# Altium footprint library MYLIB.PcbLib: 600 footprints (part 27 of 39)
Each footprint in its own frame and in the unit in brackets; x right, y up, seen from the top. Pads: shape width x height; smd on the part's side, far side on the other; paste and mask are expansions set on the pad; w line width, h text height; cw(c..) or ccw(c..) is an arc to the next point about the centre after c.
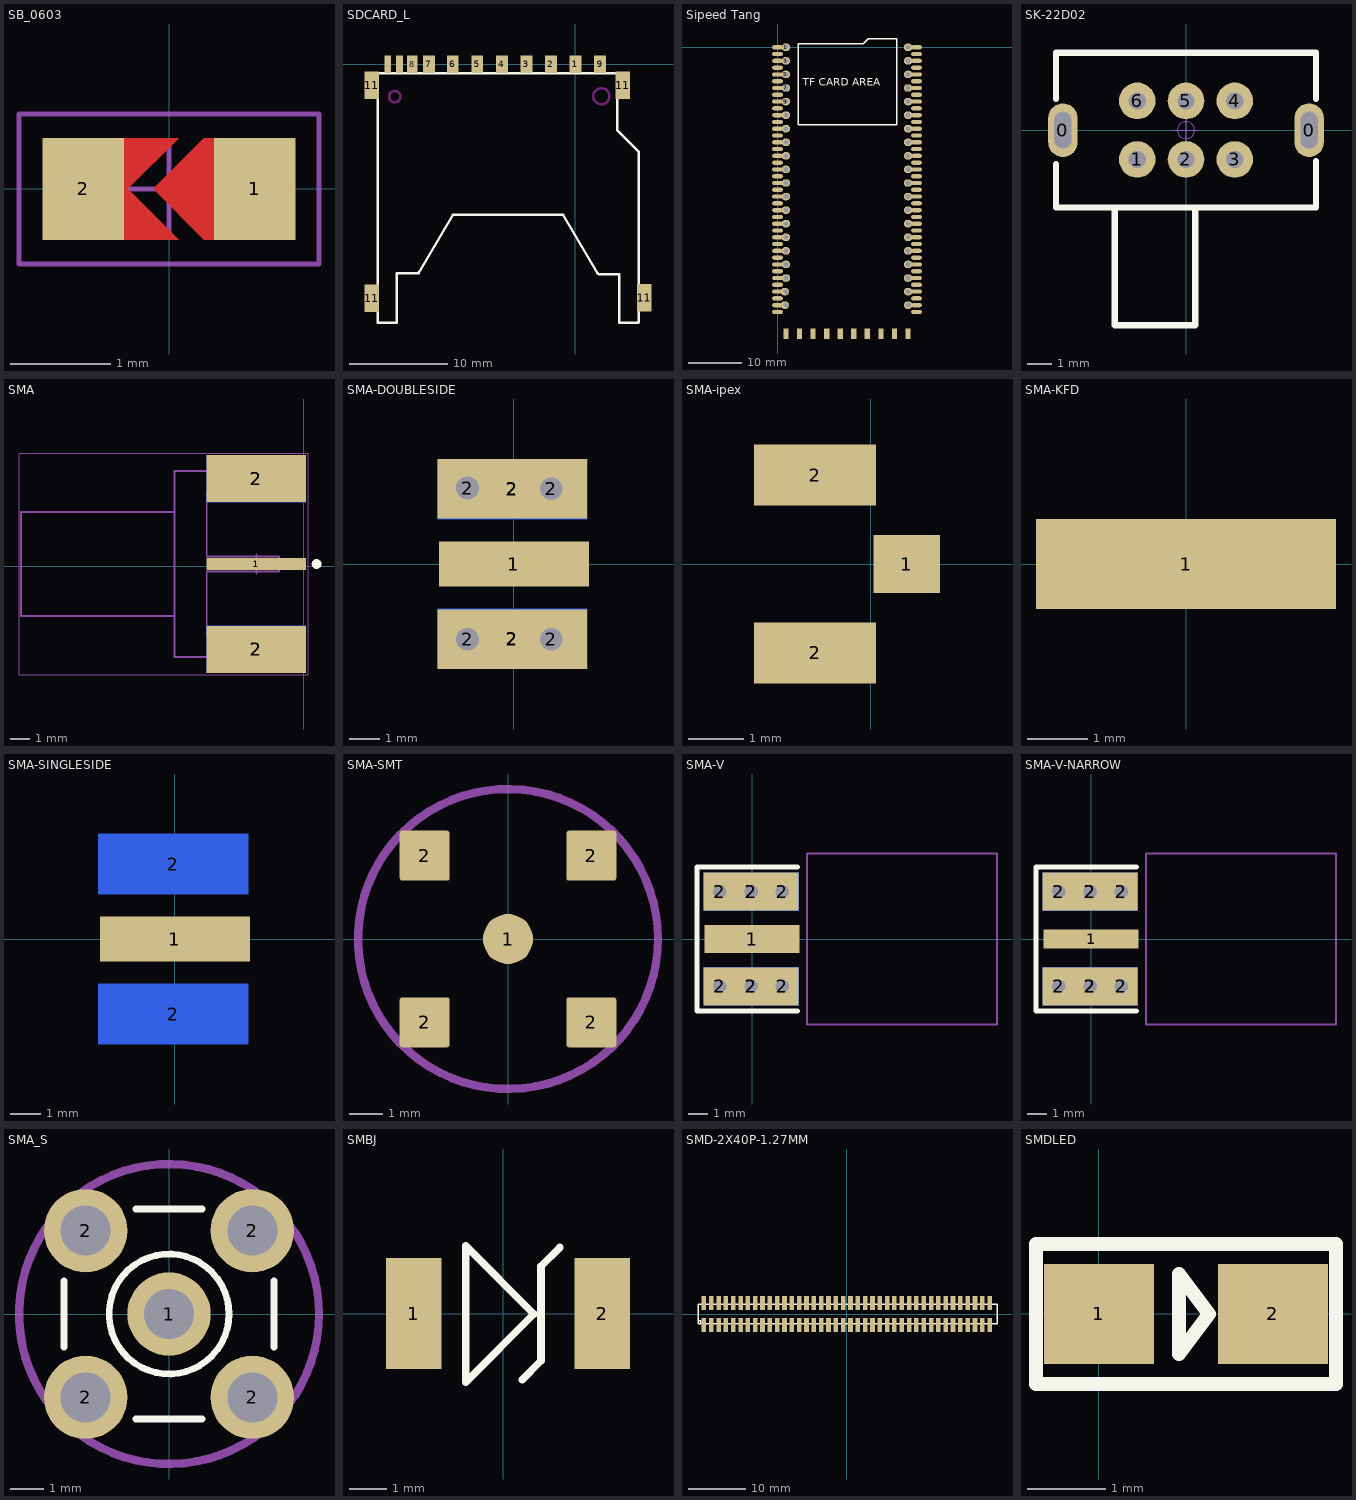
[diagram p26: the footprints below, top view; thin cyan lines are the x and y axes]

## SB_0603 [mil] "Jumper"
height 39.37
pads (2):
  rect 32x40 smd: 1(33.75,0) 2(-33.75,0)
Top Layer:
  region: 23.75,20 13.75,20 -6.25,0 13.75,-20 23.75,-20
  region: -26.25,0 -16.25,0 3.75,20 -26.25,20
  region: -26.25,0 -16.25,0 3.75,-20 -26.25,-20
Top Paste:
  region: 23.75,20 13.75,20 -6.25,0 13.75,-20 23.75,-20
  region: -26.25,0 -16.25,0 3.75,20 -26.25,20
  region: -26.25,0 -16.25,0 3.75,-20 -26.25,-20
Top Solder:
  region: 23.75,24 13.75,24 -10.25,0 13.75,-24 23.75,-24
  region: -26.25,0 -12.25,0 11.75,24 -26.25,24
  region: -26.25,0 -12.25,0 11.75,-24 -26.25,-24
Mechanical 15:
  lines w1.97: -18.7,0 18.7,0 ; 0,-18.7 0,18.7 ; -59.06,-29.53 -59.06,29.53 59.06,29.53 59.06,-29.53 -59.06,-29.53

## SDCARD_L [mm]
pads (15):
  rect 1.2x1.8 smd: 1(0,0) 2(-2.489,0) 3(-4.983,-0.009) 4(-7.483,-0.009) 5(-9.983,-0.009) 6(-12.483,-0.009) 7(-14.908,-0.009) 9(2.517,-0.009)
  rect 1.1x1.8 smd: 8(-16.612,0)
  rect 0.7x1.8 smd: 10(-17.908,-0.009) 12(-19.101,0)
  rect 1.5x2.8 smd: 11(-20.726,-23.834) 11(-20.726,-2.143) 11(4.826,-2.143) 11(7.01,-23.784)
Top Overlay:
  lines w0.254: -18.158,-21.3 -18.158,-26.3 -20.131,-26.3 -20.131,-0.914 -20.117,-0.9 4.242,-0.9 4.242,-6.71 6.431,-8.899 6.442,-8.899 6.442,-26.273 6.415,-26.3 4.442,-26.3 4.442,-21.402 2.4,-21.402 2.242,-21.244 ; -18.107,-21.294 -16.065,-21.294 -15.907,-21.136 ; -15.958,-21.294 -12.446,-15.3 ; -12.458,-15.3 -1.258,-15.3 2.242,-21.294
Keep-Out Layer:
  circle w0.254: c-18.39,-3.3 r0.58
  circle w0.254: c2.642,-3.26 r0.82

## Sipeed Tang [mm]
pads (130):
  oval 2x0.8 smd mask+0.051: 1(0,0) 2(0,-1.27) 3(0,-2.54) 4(0,-3.81) 5(0,-5.08) 6(0,-6.35) 7(0,-7.62) 8(0,-8.89) 9(0,-10.16) 10(0,-11.43) 11(0,-12.7) 12(0,-13.97) 13(0,-15.24) 14(0,-16.51) 15(0,-17.78) 16(0,-19.05) 17(0,-20.32) 18(0,-21.59) 19(0,-22.86) 20(0,-24.13) 21(0,-25.4) 22(0,-26.67) 23(0,-27.94) 24(0,-29.21) 25(0,-30.48) 26(0,-31.75) 27(0,-33.02) 28(0,-34.29) 29(0,-35.56) 30(0,-36.83) 31(0,-38.1) 32(0,-39.37) 33(0,-40.64) 34(0,-41.91) 35(0,-43.18) 36(0,-44.45) 37(0,-45.72) 38(0,-46.99) 39(0,-48.26) 40(0,-49.53) 41(26.01,-49.53) 42(26.01,-48.26) 43(26.01,-46.99) 44(26.01,-45.72) 45(26.01,-44.45) 46(26.01,-43.18) 47(26.01,-41.91) 48(26.01,-40.64) 49(26.01,-39.37) 50(26.01,-38.1) 51(26.01,-36.83) 52(26.01,-35.56) 53(26.01,-34.29) 54(26.01,-33.02) 55(26.01,-31.75) 56(26.01,-30.48) 57(26.01,-29.21) 58(26.01,-27.94) 59(26.01,-26.67) 60(26.01,-25.4) 61(26.01,-24.13) 62(26.01,-22.86) 63(26.01,-21.59) 64(26.01,-20.32) 65(26.01,-19.05) 66(26.01,-17.78) 67(26.01,-16.51) 68(26.01,-15.24) 69(26.01,-13.97) 70(26.01,-12.7) 71(26.01,-11.43) 72(26.01,-10.16) 73(26.01,-8.89) 74(26.01,-7.62) 75(26.01,-6.35) 76(26.01,-5.08) 77(26.01,-3.81) 78(26.01,-2.54) 79(26.01,-1.27) 80(26.01,0)
  oval 1.6x1.4 hole 0.9 mask+0.051: 1(1.575,0) 3(1.575,-2.54) 5(1.575,-5.08) 7(1.575,-7.62) 9(1.575,-10.16) 11(1.575,-12.7) 13(1.575,-15.24) 15(1.575,-17.78) 17(1.575,-20.32) 19(1.575,-22.86) 21(1.575,-25.4) 23(1.575,-27.94) 25(1.575,-30.48) 27(1.575,-33.02) 29(1.575,-35.56) 31(1.575,-38.1) 33(1.575,-40.64) 35(1.575,-43.18) 42(24.435,-48.26) 44(24.435,-45.72) 46(24.435,-43.18) 48(24.435,-40.64) 50(24.435,-38.1) 52(24.435,-35.56) 54(24.435,-33.02) 56(24.435,-30.48) 58(24.435,-27.94) 60(24.435,-25.4) 62(24.435,-22.86) 64(24.435,-20.32) 66(24.435,-17.78) 68(24.435,-15.24) 70(24.435,-12.7) 72(24.435,-10.16) 74(24.435,-7.62) 76(24.435,-5.08) 78(24.435,-2.54) 80(24.435,0)
  oval 1.6x1.4 hole 0.9 copper offset -0.2,0 mask+0.051: 37(1.575,-45.72) 39(1.575,-48.26)
  rect 1x2 smd mask+0.051: 81(1.575,-53.594) 82(4.115,-53.594) 83(6.655,-53.594) 84(9.195,-53.594) 85(11.735,-53.594) 86(14.275,-53.594) 87(16.815,-53.594) 88(19.355,-53.594) 89(21.895,-53.594) 90(24.435,-53.594)
Top Overlay:
  lines w0.254: 3.835,-14.478 3.835,0.66 16.053,0.66 16.942,1.549 17.704,1.549 22.327,1.549 22.327,-14.478 20.98,-14.478 6.045,-14.478 3.835,-14.478
  text "TF CARD AREA" at 4.699,-7.798 h2.5
3D body "LicheeTang-RV_3.28.step": height 3.72, standoff -2.16, extent 0.251,-55.485 25.781,3.06

## SK-22D02 [mm] "10.4x6.1x4.2mm(长宽高)，脚距：2mm"
pads (8):
  oval 1.2x2.2 hole 0.7 slot 1.5 at 90 deg: 0(-5.05,0) 0(5.05,0)
  round 1.5 hole 0.7: 1(-2,-1.2) 2(0,-1.2) 3(2,-1.2) 4(2,1.2) 5(0,1.2) 6(-2,1.2)
Top Overlay:
  lines w0.25: -5.334,-1.397 -5.334,-3.175 5.334,-3.175 5.334,-1.27 ; -5.334,1.27 -5.334,3.175 5.334,3.175 5.334,1.27 ; -2.921,-3.175 -2.921,-8.001 0.381,-8.001 0.381,-3.175
Mechanical 15:
  circle w0.05: c0,0 r0.35
  lines w0.05: -0.5,0 0.5,0 ; 0,-0.5 0,0.5
3D body "SK-22D02.STEP": height 5.59, standoff -2.61, extent -5.266,-7.963 5.254,3.047

## SMA [mil]
pads (5):
  rect 200x24 smd: 1(-96,5)
  rect 200x95 smd: 2(-96,-167.5) 2(-96,177.5)
  rect 200x95 smd far side: 2(-96,-167.5) 2(-96,177.5)
Top Overlay:
  circle w9.84: c25.65,5 r4.92
Mechanical 13:
  lines w3.94: -571,-100.12 -571,110.12 -261,110.12 ; -570.88,-100.12 -261,-100.12 ; -261,-182.5 -9,-182.5 -9,-142.5 -196,-142.5 -196,-10 -49.94,-10 -49.94,20 -196,20 -196,152.5 -9,152.5 -9,192.5 -261,192.5 -261,-182.5
Mechanical 15:
  lines w1.97: -574.94,-218.96 -574.94,228.94 7.94,228.94 7.94,-218.96 -574.94,-218.96
  lines w3.94: -115.69,5 -76.31,5 ; -96,-14.69 -96,24.68
3D body "142-0701-801.STEP": height 171.37, standoff -140.44, extent -570.81,-182.5 -9,192.3

## SMA-DOUBLESIDE [mil]
pads (9):
  rect 196.85x59.06 smd: 1(0,0)
  round 60 hole 30: 2(-61,-99) 2(-61,100) 2(49,-99) 2(49,99)
  rect 196.85x78.74 smd: 2(-2,-99) 2(-2,99)
  rect 196.85x78.74 smd far side: 2(-1.97,-98.43) 2(-1.97,98.43)
Bottom Overlay:
  lines w10: 94.49,-149.61 -114.17,-149.61 -114.17,149.61 94.49,149.61

## SMA-ipex [mm]
pads (3):
  rect 1.2x1.05 smd: 1(0.65,0)
  rect 2.2x1.1 smd: 2(-1,-1.6) 2(-1,1.6)

## SMA-KFD [mm]
pads (1):
  rect 5x1.5 smd: 1(0,0)

## SMA-SINGLESIDE [mm]
pads (3):
  rect 5x1.5 smd: 1(0,0)
  rect 5x2 smd far side: 2(-0.05,-2.5) 2(-0.05,2.5)
Bottom Overlay:
  lines w0.254: 2.4,-3.8 -2.9,-3.8 -2.9,3.8 2.4,3.8

## SMA-SMT [mm]
pads (5):
  round 1.5 smd: 1(0,0)
  rrect10% 1.5x1.5 smd: 2(-2.5,-2.5) 2(-2.5,2.5) 2(2.5,-2.5) 2(2.5,2.5)
Mechanical 13:
  circle w0.254: c0,0 r4.5

## SMA-V [mm]
pads (11):
  rect 5x1.5 smd: 1(0,0)
  round 1.27 hole 0.711: 2(-1.7,-2.5) 2(-1.7,2.5) 2(-0.05,-2.5) 2(-0.05,2.5) 2(1.6,-2.5) 2(1.6,2.5)
  rect 5x2 smd: 2(-0.05,-2.5) 2(-0.05,2.5)
  rect 5x2 smd far side: 2(-0.05,-2.5) 2(-0.05,2.5)
Top Overlay:
  lines w0.254: 2.4,-3.8 -2.9,-3.8 -2.9,3.8 2.4,3.8
Bottom Overlay:
  lines w0.254: 2.4,-3.8 -2.9,-3.8 -2.9,3.8 2.4,3.8
Mechanical 13:
  lines w0.1: 2.9,-4.5 12.9,-4.5 12.9,4.5 2.9,4.5 2.9,-4.5
3D body: height 4.5, standoff -4.5, extent 2.9,-4.5 12.9,4.5

## SMA-V-NARROW [mm]
pads (11):
  rect 5x1 smd: 1(0,0)
  round 1.27 hole 0.711: 2(-1.7,-2.5) 2(-1.7,2.5) 2(-0.05,-2.5) 2(-0.05,2.5) 2(1.6,-2.5) 2(1.6,2.5)
  rect 5x2 smd: 2(-0.05,-2.5) 2(-0.05,2.5)
  rect 5x2 smd far side: 2(-0.05,-2.5) 2(-0.05,2.5)
Top Overlay:
  lines w0.254: 2.4,-3.8 -2.9,-3.8 -2.9,3.8 2.4,3.8
Bottom Overlay:
  lines w0.254: 2.4,-3.8 -2.9,-3.8 -2.9,3.8 2.4,3.8
Mechanical 13:
  lines w0.1: 2.9,-4.5 2.9,4.5 12.9,4.5 12.9,-4.5 2.9,-4.5
3D body: height 4.5, standoff -4.5, extent 2.9,-4.5 12.9,4.5

## SMA_S [mm]
pads (5):
  round 2.5 hole 1.5: 1(0,0) 2(-2.5,-2.5) 2(-2.5,2.5) 2(2.5,-2.5) 2(2.5,2.5)
Top Overlay:
  circle w0.2: c0,0 r1.8
  lines w0.2: -3.15,-1 -3.15,1 ; -1,-3.15 1,-3.15 ; -1,3.15 1,3.15 ; 3.15,-1 3.15,1
Mechanical 13:
  circle w0.025: c0,0 r0.2
  circle w0.025: c0,0 r1.05
  circle w0.025: c0,0 r1.8
  circle w0.254: c0,0 r4.5

## SMBJ [mm]
pads (2):
  rect 1.5x3 smd: 1(-2.413,0) 2(2.667,0)
Top Overlay:
  lines w0.203: 0.508,-1.778 1.016,-1.27 1.016,1.27 1.524,1.778 ; -1.016,-1.854 0.826,-0.013 -1.016,1.829 -1.016,-1.854

## SMD-2X40P-1.27MM [mm]
pads (80):
  rect 0.8x2.4 smd: 1(-24.765,-1.904) 2(-24.765,1.906) 3(-23.495,-1.904) 4(-23.495,1.906) 5(-22.225,-1.904) 6(-22.225,1.906) 7(-20.955,-1.904) 8(-20.955,1.906) 9(-19.685,-1.904) 10(-19.685,1.906) 11(-18.415,-1.904) 12(-18.415,1.906) 13(-17.145,-1.904) 14(-17.145,1.906) 15(-15.875,-1.904) 16(-15.875,1.906) 17(-14.605,-1.904) 18(-14.605,1.906) 19(-13.335,-1.904) 20(-13.335,1.906) 21(-12.065,-1.904) 22(-12.065,1.906) 23(-10.795,-1.904) 24(-10.795,1.906) 25(-9.525,-1.904) 26(-9.525,1.906) 27(-8.255,-1.904) 28(-8.255,1.906) 29(-6.985,-1.904) 30(-6.985,1.906) 31(-5.715,-1.904) 32(-5.715,1.906) 33(-4.445,-1.904) 34(-4.445,1.906) 35(-3.175,-1.904) 36(-3.175,1.906) 37(-1.905,-1.904) 38(-1.905,1.906) 39(-0.635,-1.904) 40(-0.635,1.906) 41(0.635,-1.904) 42(0.635,1.906) 43(1.905,-1.904) 44(1.905,1.906) 45(3.175,-1.904) 46(3.175,1.906) 47(4.445,-1.904) 48(4.445,1.906) 49(5.715,-1.904) 50(5.715,1.906) 51(6.985,-1.904) 52(6.985,1.906) 53(8.255,-1.904) 54(8.255,1.906) 55(9.525,-1.904) 56(9.525,1.906) 57(10.795,-1.904) 58(10.795,1.906) 59(12.065,-1.904) 60(12.065,1.906) 61(13.335,-1.904) 62(13.335,1.906) 63(14.605,-1.904) 64(14.605,1.906) 65(15.875,-1.904) 66(15.875,1.906) 67(17.145,-1.904) 68(17.145,1.906) 69(18.415,-1.904) 70(18.415,1.906) 71(19.685,-1.904) 72(19.685,1.906) 73(20.955,-1.904) 74(20.955,1.906) 75(22.225,-1.904) 76(22.227,1.904) 77(23.497,-1.906) 78(23.495,1.906) 79(24.765,-1.904) 80(24.765,1.906)
Top Overlay:
  lines w0.254: -25.781,-1.142 -25.273,-1.142 -25.273,-1.65 ; -25.781,-1.65 -25.781,-1.396 -25.781,1.652 26.035,1.652 26.035,-1.65 -25.781,-1.65

## SMDLED [mm]
pads (2):
  rect 1.4x1.27 smd: 1(0.001,-0.002) 2(2.211,-0.002)
Top Overlay:
  lines w0.178: 3.012,0.887 3.011,0.887 ; 3.011,0.887 -0.799,0.887 -0.799,-0.002 -0.799,-0.891 3.011,-0.891 3.011,0.887 ; 1.017,-0.51 1.398,-0.002 1.017,0.506 1.017,-0.51